# Altium footprint library VESC_MotorController.PcbLib: 146 footprints (part 6 of 10)
Each footprint in its own frame and in the unit in brackets; x right, y up, seen from the top. Pads: shape width x height; smd on the part's side, far side on the other; paste and mask are expansions set on the pad; w line width, h text height; cw(c..) or ccw(c..) is an arc to the next point about the centre after c.
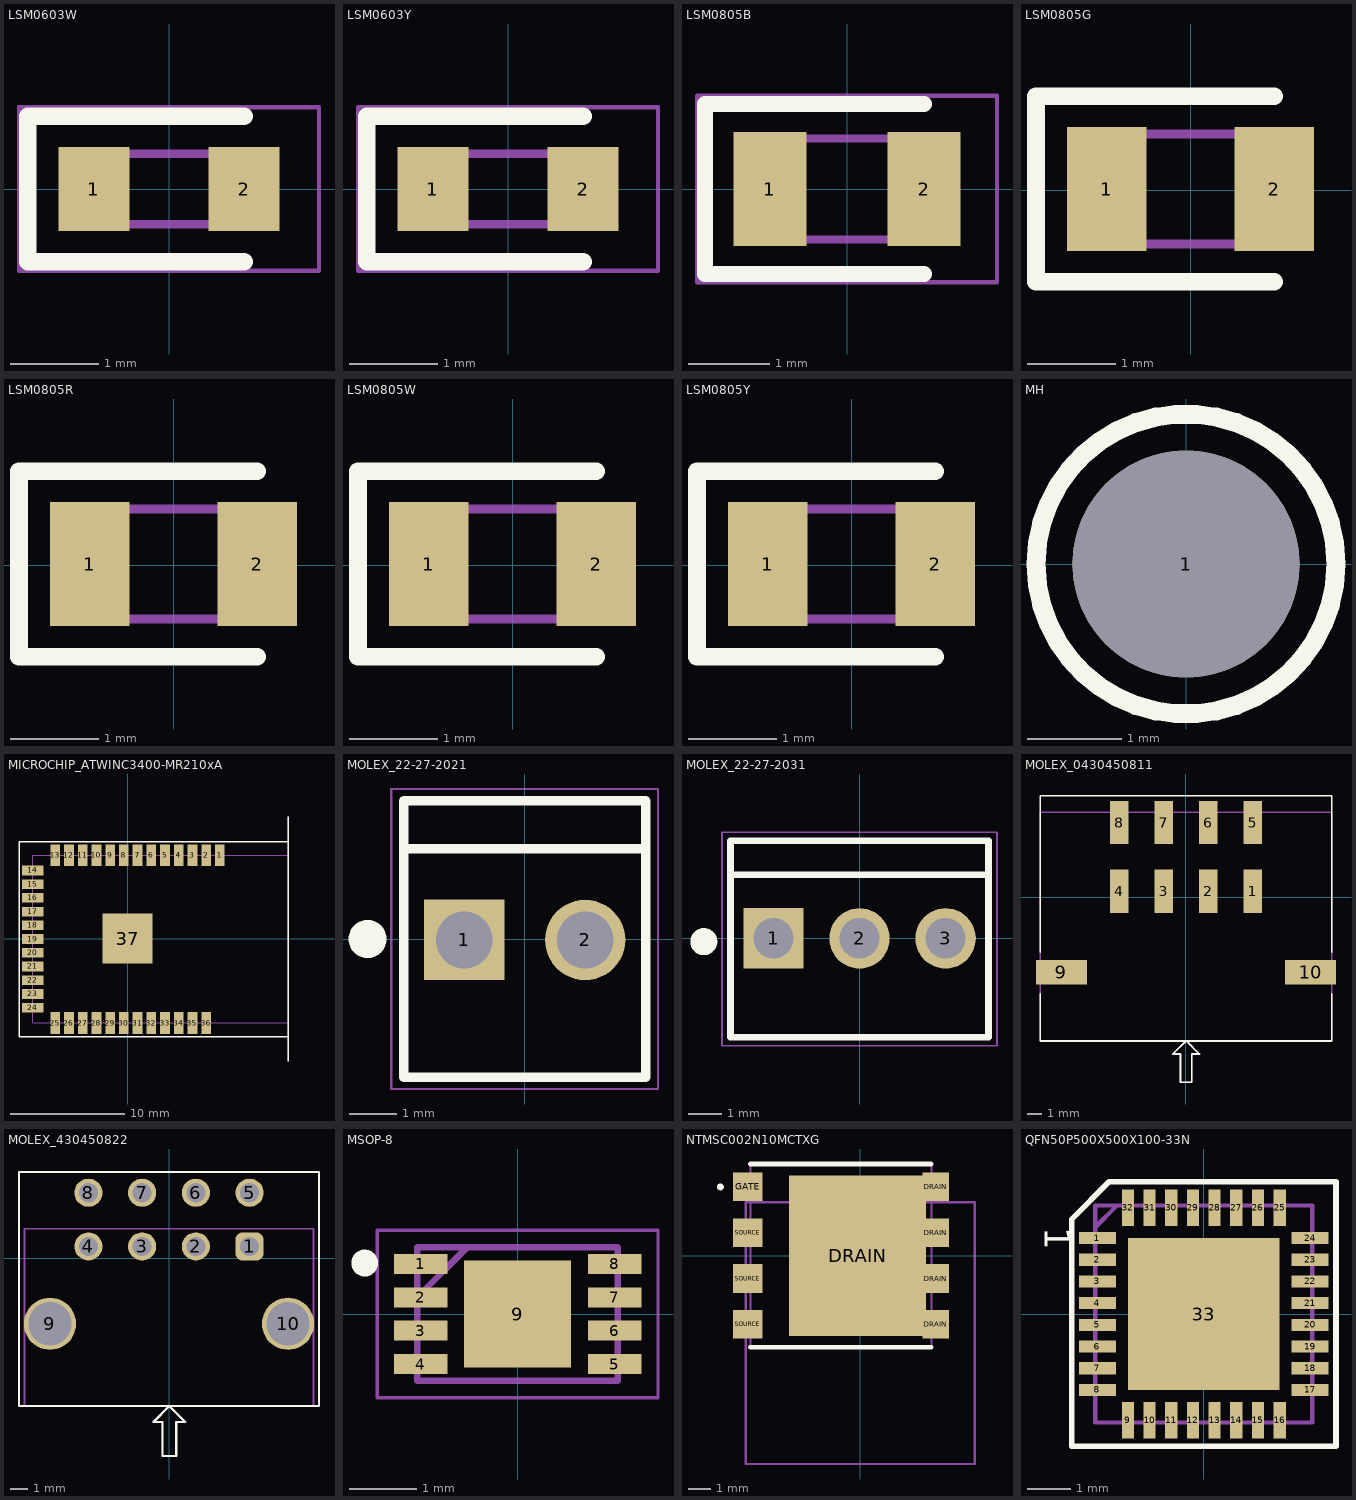
[diagram p5: the footprints below, top view; thin cyan lines are the x and y axes]

## LSM0603W [mm]
pads (2):
  rect 0.8x0.95 smd: 1(-0.85,0) 2(0.85,0)
Top Overlay:
  lines w0.2: 0.85,-0.825 -1.6,-0.825 -1.6,0.825 0.85,0.825
Mechanical 15:
  lines w0.1: -0.8,0.133 -0.533,0.4 ; -0.8,-0.4 -0.8,0.4 0.8,0.4 0.8,-0.4 -0.8,-0.4
Mechanical 20:
  lines w0.05: -1.7,-0.925 -1.7,0.925 1.7,0.925 1.7,-0.925 -1.7,-0.925
3D body "LSM0603W.stp": height 0.55, standoff -0.03, extent -0.8,-0.4 0.8,0.4

## LSM0603Y [mm]
pads (2):
  rect 0.8x0.95 smd: 1(-0.85,0) 2(0.85,0)
Top Overlay:
  lines w0.2: 0.85,-0.825 -1.6,-0.825 -1.6,0.825 0.85,0.825
Mechanical 15:
  lines w0.1: -0.8,0.133 -0.533,0.4 ; -0.8,-0.4 0.8,-0.4 0.8,0.4 -0.8,0.4 -0.8,-0.4
Mechanical 20:
  lines w0.05: -1.7,-0.925 1.7,-0.925 1.7,0.925 -1.7,0.925 -1.7,-0.925
3D body "LSM0603Y.stp": height 0.55, standoff -0.03, extent -0.8,-0.4 0.8,0.4

## LSM0805B [mm]
pads (2):
  rect 0.9x1.4 smd: 1(-0.95,0) 2(0.95,0)
Top Overlay:
  lines w0.2: 0.95,-1.05 -1.75,-1.05 -1.75,1.05 0.95,1.05
Mechanical 15:
  lines w0.1: -1,0.208 -0.583,0.625 ; -1,-0.625 -1,0.625 1,0.625 1,-0.625 -1,-0.625
Mechanical 20:
  lines w0.05: -1.85,-1.15 -1.85,1.15 1.85,1.15 1.85,-1.15 -1.85,-1.15
3D body "LSM0805B.STP": height 0.92, standoff 0, extent -1,-0.625 1,0.625

## LSM0805G [mm]
pads (2):
  rect 0.9x1.4 smd: 1(-0.957,0.012) 2(0.943,0.012)
Top Overlay:
  lines w0.2: 0.943,-1.038 -1.757,-1.038 -1.757,1.062 0.943,1.062
Mechanical 15:
  lines w0.1: -1.007,0.22 -0.59,0.637 ; -1.007,-0.613 0.993,-0.613 0.993,0.637 -1.007,0.637 -1.007,-0.613
3D body "LSM0805G.STP": height 0.92, standoff 0, extent -1.007,-0.613 0.993,0.637

## LSM0805R [mm]
pads (2):
  rect 0.9x1.4 smd: 1(-0.957,0.012) 2(0.943,0.012)
Top Overlay:
  lines w0.2: 0.943,-1.038 -1.757,-1.038 -1.757,1.062 0.943,1.062
Mechanical 15:
  lines w0.1: -1.007,0.22 -0.59,0.637 ; -1.007,-0.613 0.993,-0.613 0.993,0.637 -1.007,0.637 -1.007,-0.613
3D body "LSM0805R.STP": height 0.92, standoff 0, extent -1.007,-0.613 0.993,0.637

## LSM0805W [mm]
pads (2):
  rect 0.9x1.4 smd: 1(-0.957,0.012) 2(0.943,0.012)
Top Overlay:
  lines w0.2: 0.943,-1.038 -1.757,-1.038 -1.757,1.062 0.943,1.062
Mechanical 15:
  lines w0.1: -1.007,0.22 -0.59,0.637 ; -1.007,-0.613 0.993,-0.613 0.993,0.637 -1.007,0.637 -1.007,-0.613
3D body "LSM0805W.STP": height 0.92, standoff 0, extent -1.007,-0.613 0.993,0.637

## LSM0805Y [mm]
pads (2):
  rect 0.9x1.4 smd: 1(-0.957,0.012) 2(0.943,0.012)
Top Overlay:
  lines w0.2: 0.943,-1.038 -1.757,-1.038 -1.757,1.062 0.943,1.062
Mechanical 15:
  lines w0.1: -1.007,0.22 -0.59,0.637 ; -1.007,-0.613 -1.007,0.637 0.993,0.637 0.993,-0.613 -1.007,-0.613
3D body "LSM0805Y.STP": height 0.92, standoff 0, extent -1.007,-0.613 0.993,0.637

## MH [mm]
pads (1):
  round 2.4 hole 2.4 unplated: 1(0,0)
Top Overlay:
  circle w0.2: c0,0 r1.585
Mechanical 13:
  circle w0.102: c0,0 r1.585

## MICROCHIP_ATWINC3400-MR210xA [mm] "ATWINC3400-MR210xA"
height 2
pads (37):
  rect 0.85x1.905 smd mask+0.051: 1(8.105,7.318) 2(6.901,7.318) 3(5.697,7.318) 4(4.493,7.318) 5(3.289,7.318) 6(2.085,7.318) 7(0.881,7.318) 8(-0.323,7.318) 9(-1.527,7.318) 10(-2.731,7.318) 11(-3.935,7.318) 12(-5.139,7.318) 13(-6.343,7.318) 25(-6.343,-7.414) 26(-5.139,-7.414) 27(-3.935,-7.414) 28(-2.731,-7.414) 29(-1.527,-7.414) 30(-0.323,-7.414) 31(0.881,-7.414) 32(2.085,-7.414) 33(3.289,-7.414) 34(4.493,-7.414) 35(5.697,-7.414) 36(6.901,-7.414)
  rect 1.905x0.85 smd mask+0.051: 14(-8.328,5.974) 15(-8.328,4.77) 16(-8.328,3.566) 17(-8.328,2.362) 18(-8.328,1.158) 19(-8.328,-0.046) 20(-8.328,-1.25) 21(-8.328,-2.454) 22(-8.328,-3.658) 23(-8.328,-4.862) 24(-8.328,-6.066)
  rect 4.4x4.4 smd mask+0.051: 37(0,0)
Top Overlay:
  lines w0.127: 14.104,-10.751 14.104,-7.407 ; 14.104,7.325 14.104,10.668 ; -9.525,-8.636 -9.525,8.509 14.104,8.509 14.104,-8.636 -9.525,-8.636
Mechanical 13:
  lines w0.102: 14.104,-10.751 14.104,-7.407 ; 14.104,10.668 14.104,7.325 ; 14.104,-7.407 14.104,7.325 ; 14.104,-7.407 -8.324,-7.407 -8.324,7.325 14.104,7.325
  text "PCB EDGE" at 14.72,11.303 h1.02
  text ".Designator" at -0.975,0.539 h1.02
3D body "ATWINC3400-MR210CA131.STEP": height 2.19, standoff -0.02, extent -8.324,-7.408 14.102,7.324

## MOLEX_22-27-2021 [mm]
height 13.5
pads (2):
  rect 1.69x1.69 / inner round 1.69 / far side rect 1.69x1.69 hole 1.19: 1(-1.27,-0.02)
  round 1.69 hole 1.19: 2(1.27,-0.02)
Top Overlay:
  circle w0.4: c-3.302,0 r0.2
  lines w0.2: -2.54,1.9 2.54,1.9 ; -2.54,-2.9 -2.54,-1.9 -2.54,2.9 2.54,2.9 2.54,-1.9 2.54,-2.9 -2.54,-2.9
Mechanical 15:
  lines w0.05: -2.8,-3.15 2.8,-3.15 2.8,3.15 -2.8,3.15 -2.8,-3.15
3D body "22-27-2021.stp": height 12.12, standoff -3.14, extent -2.54,-2.92 2.54,2.88

## MOLEX_22-27-2031 [mm]
height 13.5
pads (3):
  rect 1.785x1.785 hole 1.19: 1(-2.54,0)
  round 1.785 hole 1.19: 2(0,0) 3(2.54,0)
Top Overlay:
  circle w0.4: c-4.6,-0.1 r0.2
  lines w0.2: -3.81,1.88 3.81,1.88 ; -3.81,-2.92 -3.81,2.88 3.81,2.88 3.81,-2.92 -3.81,-2.92
Mechanical 15:
  lines w0.05: -4.06,-3.17 4.06,-3.17 4.06,3.13 -4.06,3.13 -4.06,-3.17
3D body "22-27-2031.stp": height 12.12, standoff -3.14, extent -3.81,-2.921 3.81,2.879

## MOLEX_0430450811 [mm] "0430450811,CONN HEADER SMD R/A 8POS 3MM"
height 8
pads (10):
  rect 1.27x2.921 smd mask+0.051: 1(4.5,0.42) 2(1.5,0.42) 3(-1.5,0.42) 4(-4.5,0.42) 5(4.5,5.05) 6(1.5,5.05) 7(-1.5,5.05) 8(-4.5,5.05)
  rect 3.43x1.65 smd mask+0.051: 9(-8.395,-5.05) 10(8.395,-5.05)
Top Overlay:
  lines w0.127: -9.825,-6.507 -9.825,-9.669 9.825,-9.669 9.825,-6.507 ; -9.825,-3.671 -9.825,6.858 9.825,6.858 9.825,-3.671 ; -0.374,-10.549 -0.88,-10.549 0.009,-9.66 0.898,-10.549 0.39,-10.549 0.39,-12.454 -0.372,-12.454 -0.372,-10.549
Mechanical 13:
  lines w0.102: -0.392,-10.549 -0.898,-10.549 -0.009,-9.66 0.88,-10.549 0.372,-10.549 0.372,-12.454 -0.39,-12.454 -0.39,-10.549 ; -9.825,-9.669 9.825,-9.669 9.825,5.731 -9.825,5.731 -9.825,-9.669
  text ".Designator" at 0.618,-0.164 h1.02
3D body "430450811.stp": height 8.83, standoff 0.06, extent -9.825,-9.669 9.825,5.731

## MOLEX_430450822 [mil] "0430450822,CONN HEADER R/A 8POS 3MM"
height 346.46
pads (10):
  rrect50% 62x62 hole 42 mask+2: 1(177.17,25.98)
  round 62 hole 42 mask+2: 2(59.06,25.98) 3(-59.06,25.98) 4(-177.17,25.98) 5(177.17,144.09) 6(59.06,144.09) 7(-59.06,144.09) 8(-177.17,144.09)
  round 115 hole 95 mask+2: 9(-261.81,-144.09) 10(261.81,-144.09)
Top Overlay:
  lines w5: -14.33,-360.19 -34.26,-360.19 0.74,-325.19 35.74,-360.19 15.74,-360.19 15.74,-435.19 -14.26,-435.19 -14.26,-360.19 ; -330,-325.2 -330,190 330,190 330,-325.2 -330,-325.2
Mechanical 13:
  lines w4: -15.07,-360.2 -35,-360.2 0,-325.2 35,-360.2 15,-360.2 15,-435.2 -15,-435.2 -15,-360.2 ; -317.91,-325.2 -317.91,64.96 317.91,64.96 317.91,-325.2 -317.91,-325.2
  text ".Designator" at -27.37,-102.2 h40
3D body "430450822.stp": height 347.64, standoff -122.83, extent -318.9,-325.2 318.9,156.69

## MSOP-8 [mm]
pads (9):
  rect 0.8x0.3 smd: 1(-1.45,0.75) 2(-1.45,0.25) 3(-1.45,-0.25) 4(-1.45,-0.75) 5(1.45,-0.75) 6(1.45,-0.25) 7(1.45,0.25) 8(1.45,0.75)
  rect 1.6x1.6 smd: 9(0,0)
Top Overlay:
  circle w0.2: c-2.286,0.762 r0.1
Mechanical 15:
  lines w0.1: -1.5,0.25 -0.75,1 ; -1.5,-1 -1.5,1 1.5,1 1.5,-1 -1.5,-1
Mechanical 20:
  lines w0.05: -2.1,-1.25 2.1,-1.25 2.1,1.25 -2.1,1.25 -2.1,-1.25
3D body "MCP16311T-E_MNY.stp": height 0.8, standoff 0, extent -1.55,-1 1.55,1

## NTMSC002N10MCTXG [mm]
pads (9):
  rect 6x7 smd: DRAIN(-0.12,0)
  rect 1.15x1.25 smd: DRAIN(3.295,-3) DRAIN(3.295,-1) DRAIN(3.295,1) DRAIN(3.295,3)
  rect 1.28x1.25 smd: GATE(-4.915,3) SOURCE(-4.915,-3) SOURCE(-4.915,-1) SOURCE(-4.915,1)
Top Overlay:
  lines w0.2: -6.158,3 ccw(c-6.108,3) -6.058,3 ; -6.158,3 cw(c-6.108,3) -6.058,3 ; -6.158,3 ccw(c-6.108,3) -6.058,3 ; -4.795,-4 3.105,-4 -4.795,-4 ; -4.795,4 3.105,4 -4.795,4
Mechanical 15:
  lines w0.1: -4.795,-4 -4.795,4 3.105,4 3.105,-4 -4.795,-4
Mechanical 20:
  lines w0.1: -5,-9.095 5,-9.095 5,2.325 -5,2.325 -5,-9.095
3D body "NTMTSC002N10MCTXG.stp": height 1.02, standoff 0, extent -5.025,-4.15 3.374,4.15

## QFN50P500X500X100-33N [mm] "SGTL5000XNAA3R2,IC AUDIO CODEC STEREO 32-QFN"
height 1
pads (33):
  rect 0.85x0.28 smd mask+0.051: 1(-2.45,1.75) 2(-2.45,1.25) 3(-2.45,0.75) 4(-2.45,0.25) 5(-2.45,-0.25) 6(-2.45,-0.75) 7(-2.45,-1.25) 8(-2.45,-1.75) 17(2.45,-1.75) 18(2.45,-1.25) 19(2.45,-0.75) 20(2.45,-0.25) 21(2.45,0.25) 22(2.45,0.75) 23(2.45,1.25) 24(2.45,1.75)
  rect 0.28x0.85 smd mask+0.051: 9(-1.75,-2.45) 10(-1.25,-2.45) 11(-0.75,-2.45) 12(-0.25,-2.45) 13(0.25,-2.45) 14(0.75,-2.45) 15(1.25,-2.45) 16(1.75,-2.45) 25(1.75,2.45) 26(1.25,2.45) 27(0.75,2.45) 28(0.25,2.45) 29(-0.25,2.45) 30(-0.75,2.45) 31(-1.25,2.45) 32(-1.75,2.45)
  rect 3.5x3.5 smd paste-4 mask+0.051: 33(0,0)
Top Overlay:
  lines w0.127: -3.048,-3.048 -3.048,2.181 -2.181,3.048 3.048,3.048 3.048,-3.048 -3.048,-3.048
  text "1" at -3.867,2.001 h1.02
Top Paste:
  rectangle: -1.6,0.711 -0.711,1.6
  rectangle: -0.457,0.711 0.432,1.6
  rectangle: 0.686,0.711 1.575,1.6
  rectangle: -1.6,-0.432 -0.711,0.457
  rectangle: -0.457,-0.432 0.432,0.457
  rectangle: 0.686,-0.432 1.575,0.457
  rectangle: -1.6,-1.575 -0.711,-0.686
  rectangle: -0.457,-1.575 0.432,-0.686
  rectangle: 0.686,-1.575 1.575,-0.686
Mechanical 13:
  lines w0.102: -2.5,2 -2,2.5 ; -2.5,-2.5 2.5,-2.5 2.5,2.5 -2.5,2.5 -2.5,-2.5
  text ".Designator" at -0.115,0.479 h1.02
  text "1" at -2.307,1.944 h1.02
  text "9" at -2.013,-1.89 h1.02
  text "17" at 1.574,-1.313 h1.02
  text "25" at 1.397,2.202 h1.02
3D body "CS42L51-CNZ.stp": height 1, standoff 0, extent -2.55,-2.55 2.55,2.55